# Altium schematic symbol library Transistor.SchLib: 3457 symbols (part 10 of 27) (continued)
## D45H8G
designator Q?
Complementary Silicon Power Transistor, 3-Pin TO-220, Pb-Free, Tube; Manufacturer: On Semiconductor; PartNumber: D45H8G; IC Continuous (A): 10; Polarity: PNP; DatasheetVersion: Rev. 12; PackageVersion: Rev. AG, 09/2011; PackageReference: TO-220-3-221A-09; PackageDescription: 3-Pin Flange Mount, Vertical Straight Lead, Body 9.97 x 4.445 mm, Pitch 2.54 mm; Supplier 1: Digi-Key; Supplier Part Number 1: D45H8GOS-ND; Supplier 2: Farnell; Supplier Part Number 2: 9556214; Supplier 3: Newark; Supplier Part Number 3: 45J0695; Supplier 4: Mouser; Supplier Part Number 4: 863-D45H8G; Packing: Tube; RoHS: TRUE; Mounting Technology: Through Hole; ComponentLink1Description: Manufacturer URL; ComponentLink1URL: http://www.onsemi.com/; ComponentLink2Description: Datasheet; ComponentLink2URL: http://www.onsemi.com/pub_link/Collateral/D44H-D.PDF; ComponentLink3Description: Package Specification; ComponentLink3URL: http://www.onsemi.com/pub_link/Collateral/221A-09.PDF
footprint ONSC-TO-220-3-221A-09 (FM, 3-Leads, Body 10.3x4.85mm, Pitch 2.54mm)
pins: 1 B, 2 C, 3 E

## D45VH10
designator Q?
Complementary Silicon Power Transistor, 3-Pin TO-220, Tube; Manufacturer: On Semiconductor; PartNumber: D45VH10; IC Continuous (A): 15; Polarity: PNP; DatasheetVersion: Rev. 7; PackageVersion: Rev. AG, 09/2011; PackageReference: TO-220-3-221A-09; PackageDescription: 3-Pin Flange Mount, Vertical Straight Lead, Body 9.97 x 4.445 mm, Pitch 2.54 mm; Supplier 1: Digi-Key; Supplier Part Number 1: D45VH10OS-ND; Packing: Tube; RoHS: FALSE; Mounting Technology: Through Hole; ComponentLink1Description: Manufacturer URL; ComponentLink1URL: http://www.onsemi.com/; ComponentLink2Description: Datasheet; ComponentLink2URL: http://www.onsemi.com/pub_link/Collateral/D44VH-D.PDF; ComponentLink3Description: Package Specification; ComponentLink3URL: http://www.onsemi.com/pub_link/Collateral/221A-09.PDF
footprint ONSC-TO-220-3-221A-09 (FM, 3-Leads, Body 10.3x4.85mm, Pitch 2.54mm)
pins: 1 B, 2 C, 3 E

## D45VH10G
designator Q?
Complementary Silicon Power Transistor, 3-Pin TO-220, Pb-Free, Tube; Manufacturer: On Semiconductor; PartNumber: D45VH10G; IC Continuous (A): 15; Polarity: PNP; DatasheetVersion: Rev. 7; PackageVersion: Rev. AG, 09/2011; PackageReference: TO-220-3-221A-09; PackageDescription: 3-Pin Flange Mount, Vertical Straight Lead, Body 9.97 x 4.445 mm, Pitch 2.54 mm; Supplier 1: Digi-Key; Supplier Part Number 1: D45VH10GOS-ND; Supplier 2: Farnell; Supplier Part Number 2: 1459055; Supplier 3: Newark; Supplier Part Number 3: 26K3588; Supplier 4: Mouser; Supplier Part Number 4: 863-D45VH10G; Packing: Tube; RoHS: TRUE; Mounting Technology: Through Hole; ComponentLink1Description: Manufacturer URL; ComponentLink1URL: http://www.onsemi.com/; ComponentLink2Description: Datasheet; ComponentLink2URL: http://www.onsemi.com/pub_link/Collateral/D44VH-D.PDF; ComponentLink3Description: Package Specification; ComponentLink3URL: http://www.onsemi.com/pub_link/Collateral/221A-09.PDF
footprint ONSC-TO-220-3-221A-09 (FM, 3-Leads, Body 10.3x4.85mm, Pitch 2.54mm)
pins: 1 B, 2 C, 3 E

## ECH8308-TL-H
designator Q?
P-Channel Power MOSFET, -12 V, -10 A, 12.5 mOhm, Single, 8-Pin ECH, Pb-Free, Tape and Reel; Manufacturer: On Semiconductor; PartNumber: ECH8308-TL-H; Channel Polarity: P Channel; Ciss Typ (pF): 2300; Coss Typ (pF): 720; Crss Typ (pF): 550; ID Max (A): 10; PD Max (W): 1.6; V(BR)DSS Min (V): 12; VGS(th) Max (V): 1.3; PackageReference: ECH-8; PackageDescription: 8-Pin SOT23, Body 2.9 x 2.3 mm, Pitch 0.65 mm; Supplier 1: Digi-Key; Supplier Part Number 1: ECH8308-TL-H-ND; Supplier 2: Newark; Supplier Part Number 2: 52T7754; Supplier 3: Mouser; Supplier Part Number 3: 863-ECH8308-TL-H; Configuration: Single; Package Type: SOT-28 FL / ECH-8; Packing: Tape and Reel; RoHS: Pb-Free; VGS Max (V): 10; Mounting Technology: Surface Mount; ComponentLink1Description: Manufacturer URL; ComponentLink1URL: http://www.onsemi.com/; ComponentLink2Description: Datasheet; ComponentLink2URL: http://www.onsemi.com/pub_link/Collateral/ECH8308-D.PDF; ComponentLink3Description: Package Specification; ComponentLink3URL: http://www.onsemi.com/pub_link/Collateral/ECH8308-D.PDF
footprint ONSC-ECH-8_V (SOT23, 8-Leads, Body 2.9x2.3mm, Pitch 0.65mm)
pins: 1 S, 2 S, 3 S, 4 G, 5 D, 6 D, 7 D, 8 D
text: 5, 6, 7, 8; 1, 2, 3

## ECH8309-TL-H
designator Q?
P-Channel Power MOSFET, -12 V, -9.5 A, 16 mOhm, Single, 8-Pin ECH, Pb-Free, Tape and Reel; Manufacturer: On Semiconductor; PartNumber: ECH8309-TL-H; Channel Polarity: P Channel; Ciss Typ (pF): 1780; Coss Typ (pF): 540; Crss Typ (pF): 390; ID Max (A): 9.5; PD Max (W): 1.5; V(BR)DSS Min (V): 12; VGS Max (V): 10; VGS(th) Max (V): 1.3; PackageReference: ECH-8; PackageDescription: 8-Pin SOT23, Body 2.9 x 2.3 mm, Pitch 0.65 mm; Supplier 1: Digi-Key; Supplier Part Number 1: ECH8309-TL-H-ND; Supplier 2: Mouser; Supplier Part Number 2: 863-ECH8309-TL-H; Configuration: Single; Package Type: SOT-28 FL / ECH-8; Packing: Tape and Reel; RoHS: Pb-Free; Mounting Technology: Surface Mount; ComponentLink1Description: Manufacturer URL; ComponentLink1URL: http://www.onsemi.com/; ComponentLink2Description: Datasheet; ComponentLink2URL: http://www.onsemi.com/pub_link/Collateral/ECH8309-D.PDF; ComponentLink3Description: Package Specification; ComponentLink3URL: http://www.onsemi.com/pub_link/Collateral/ECH8308-D.PDF
footprint ONSC-ECH-8_V (SOT23, 8-Leads, Body 2.9x2.3mm, Pitch 0.65mm)
pins: 1 S, 2 S, 3 S, 4 G, 5 D, 6 D, 7 D, 8 D
text: 5, 6, 7, 8; 1, 2, 3

## ECH8310-TL-H
designator Q?
P-Channel Power MOSFET, -30 V, -9 A, 17 mOhm, Single, 8-Pin ECH, Pb-Free, Tape and Reel; Manufacturer: On Semiconductor; PartNumber: ECH8310-TL-H; Channel Polarity: P Channel; Ciss Typ (pF): 1400; Coss Typ (pF): 350; Crss Typ (pF): 250; ID Max (A): 9; PD Max (W): 1.5; V(BR)DSS Min (V): 30; VGS Max (V): 20; VGS(th) Max (V): 2.6; PackageReference: ECH-8; PackageDescription: 8-Pin SOT23, Body 2.9 x 2.3 mm, Pitch 0.65 mm; Supplier 1: Digi-Key; Supplier Part Number 1: ECH8310-TL-H-ND; Supplier 2: Mouser; Supplier Part Number 2: 863-ECH8310-TL-H; Configuration: Single; Package Type: SOT-28 FL / ECH-8; Packing: Tape and Reel; RoHS: Pb-Free; Mounting Technology: Surface Mount; ComponentLink1Description: Manufacturer URL; ComponentLink1URL: http://www.onsemi.com/; ComponentLink2Description: Datasheet; ComponentLink2URL: http://www.onsemi.com/pub_link/Collateral/ECH8310-D.PDF; ComponentLink3Description: Package Specification; ComponentLink3URL: http://www.onsemi.com/pub_link/Collateral/ECH8308-D.PDF
footprint ONSC-ECH-8_V (SOT23, 8-Leads, Body 2.9x2.3mm, Pitch 0.65mm)
pins: 1 S, 2 S, 3 S, 4 G, 5 D, 6 D, 7 D, 8 D
text: 5, 6, 7, 8; 1, 2, 3

## ECH8315-TL-H
designator Q?
P-Channel Power MOSFET, -30 V, -7.5 A, 25 mOhm, Single, 8-Pin ECH, Pb-Free, Tape and Reel; Manufacturer: On Semiconductor; PartNumber: ECH8315-TL-H; Channel Polarity: P Channel; Ciss Typ (pF): 875; Coss Typ (pF): 200; Crss Typ (pF): 150; ID Max (A): 7.5; PD Max (W): 1.5; V(BR)DSS Min (V): 30; VGS Max (V): 20; VGS(th) Max (V): 2.6; PackageReference: ECH-8; PackageDescription: 8-Pin SOT23, Body 2.9 x 2.3 mm, Pitch 0.65 mm; Supplier 1: Digi-Key; Supplier Part Number 1: ECH8315-TL-H-ND; Supplier 2: Mouser; Supplier Part Number 2: 863-ECH8315-TL-H; Configuration: Single; Package Type: SOT-28 FL / ECH-8; Packing: Tape and Reel; RoHS: Pb-Free; Mounting Technology: Surface Mount; ComponentLink1Description: Manufacturer URL; ComponentLink1URL: http://www.onsemi.com/; ComponentLink2Description: Datasheet; ComponentLink2URL: http://www.onsemi.com/pub_link/Collateral/ENA1387-D.PDF; ComponentLink3Description: Package Specification; ComponentLink3URL: http://www.onsemi.com/pub_link/Collateral/ECH8308-D.PDF
footprint ONSC-ECH-8_V (SOT23, 8-Leads, Body 2.9x2.3mm, Pitch 0.65mm)
pins: 1 S, 2 S, 3 S, 4 G, 5 D, 6 D, 7 D, 8 D
text: 5, 6, 7, 8; 1, 2, 3

## ECH8320-TL-H
designator Q?
P-Channel Power MOSFET, -20 V, -9.5 A, 14.5 mOhm, Single, 8-Pin ECH, Pb-Free, Tape and Reel; Manufacturer: On Semiconductor; PartNumber: ECH8320-TL-H; Channel Polarity: P Channel; Ciss Typ (pF): 2300; Coss Typ (pF): 440; Crss Typ (pF): 340; ID Max (A): 9.5; PD Max (W): 1.6; V(BR)DSS Min (V): 20; VGS Max (V): 10; VGS(th) Max (V): 1.3; PackageReference: ECH-8; PackageDescription: 8-Pin SOT23, Body 2.9 x 2.3 mm, Pitch 0.65 mm; Supplier 1: Digi-Key; Supplier Part Number 1: ECH8320-TL-H-ND; Supplier 2: Mouser; Supplier Part Number 2: 863-ECH8320-TL-H; Configuration: Single; Package Type: SOT-28 FL / ECH-8; Packing: Tape and Reel; RoHS: Pb-Free; Mounting Technology: Surface Mount; ComponentLink1Description: Manufacturer URL; ComponentLink1URL: http://www.onsemi.com/; ComponentLink2Description: Datasheet; ComponentLink2URL: http://www.onsemi.com/pub_link/Collateral/ECH8320-D.PDF; ComponentLink3Description: Package Specification; ComponentLink3URL: http://www.onsemi.com/pub_link/Collateral/ECH8308-D.PDF
footprint ONSC-ECH-8_V (SOT23, 8-Leads, Body 2.9x2.3mm, Pitch 0.65mm)
pins: 1 S, 2 S, 3 S, 4 G, 5 D, 6 D, 7 D, 8 D
text: 5, 6, 7, 8; 1, 2, 3

## ECH8410-TL-H
designator Q?
N-Channel Power MOSFET, 30 V, 12 A, 10 mOhm, Single, 8-Pin ECH, Pb-Free, Tape and Reel; Manufacturer: On Semiconductor; PartNumber: ECH8410-TL-H; Channel Polarity: N Channel; Ciss Typ (pF): 1700; Coss Typ (pF): 300; Crss Typ (pF): 200; ID Max (A): 12; PD Max (W): 1.6; V(BR)DSS Min (V): 30; VGS Max (V): 20; VGS(th) Max (V): 2.6; PackageReference: ECH-8; PackageDescription: 8-Pin SOT23, Body 2.9 x 2.3 mm, Pitch 0.65 mm; Supplier 1: Digi-Key; Supplier Part Number 1: ECH8410-TL-H-ND; Supplier 2: Mouser; Supplier Part Number 2: 863-ECH8410-TL-H; Configuration: Single; Package Type: SOT-28 FL / ECH-8; Packing: Tape and Reel; RoHS: Pb-Free; Mounting Technology: Surface Mount; ComponentLink1Description: Manufacturer URL; ComponentLink1URL: http://www.onsemi.com/; ComponentLink2Description: Datasheet; ComponentLink2URL: http://www.onsemi.com/pub_link/Collateral/ECH8410-D.PDF; ComponentLink3Description: Package Specification; ComponentLink3URL: http://www.onsemi.com/pub_link/Collateral/ECH8308-D.PDF
footprint ONSC-ECH-8_V (SOT23, 8-Leads, Body 2.9x2.3mm, Pitch 0.65mm)
pins: 1 S, 2 S, 3 S, 4 G, 5 D, 6 D, 7 D, 8 D
text: 5, 6, 7, 8; 1, 2, 3

## ECH8419-TL-H
designator Q?
N-Channel Power MOSFET, 35 V, 9 A, 17 mOhm, Single, 8-Pin ECH, Pb-Free, Tape and Reel; Manufacturer: On Semiconductor; PartNumber: ECH8419-TL-H; Channel Polarity: N Channel; Ciss Typ (pF): 960; Coss Typ (pF): 130; Crss Typ (pF): 80; ID Max (A): 9; PD Max (W): 1.5; V(BR)DSS Min (V): 35; VGS Max (V): 20; VGS(th) Max (V): 2.6; PackageReference: ECH-8; PackageDescription: 8-Pin SOT23, Body 2.9 x 2.3 mm, Pitch 0.65 mm; Supplier 1: Digi-Key; Supplier Part Number 1: ECH8419-TL-H-ND; Supplier 2: Newark; Supplier Part Number 2: 65T1217; Supplier 3: Mouser; Supplier Part Number 3: 863-ECH8419-TL-H; Configuration: Single; Package Type: SOT-28 FL / ECH-8; Packing: Tape and Reel; RoHS: Pb-Free; Mounting Technology: Surface Mount; ComponentLink1Description: Manufacturer URL; ComponentLink1URL: http://www.onsemi.com/; ComponentLink2Description: Datasheet; ComponentLink2URL: http://www.onsemi.com/pub_link/Collateral/ENA1886-D.PDF; ComponentLink3Description: Package Specification; ComponentLink3URL: http://www.onsemi.com/pub_link/Collateral/ECH8308-D.PDF
footprint ONSC-ECH-8_V (SOT23, 8-Leads, Body 2.9x2.3mm, Pitch 0.65mm)
pins: 1 S, 2 S, 3 S, 4 G, 5 D, 6 D, 7 D, 8 D
text: 5, 6, 7, 8; 1, 2, 3

## ECH8420-TL-H
designator Q?
N-Channel Power MOSFET, 20 V, 14 A, 6.8 mOhm, Single, 8-Pin ECH, Pb-Free, Tape and Reel; Manufacturer: On Semiconductor; PartNumber: ECH8420-TL-H; Channel Polarity: N Channel; Ciss Typ (pF): 2430; Coss Typ (pF): 410; Crss Typ (pF): 330; ID Max (A): 14; PD Max (W): 1.6; V(BR)DSS Min (V): 20; VGS Max (V): 12; VGS(th) Max (V): 1.3; PackageReference: ECH-8; PackageDescription: 8-Pin SOT23, Body 2.9 x 2.3 mm, Pitch 0.65 mm; Supplier 1: Digi-Key; Supplier Part Number 1: ECH8420-TL-H-ND; Supplier 2: Newark; Supplier Part Number 2: 07W6844; Supplier 3: Mouser; Supplier Part Number 3: 863-ECH8420-TL-H; Configuration: Single; Package Type: SOT-28 FL / ECH-8; Packing: Tape and Reel; RoHS: Pb-Free; Mounting Technology: Surface Mount; ComponentLink1Description: Manufacturer URL; ComponentLink1URL: http://www.onsemi.com/; ComponentLink2Description: Datasheet; ComponentLink2URL: http://www.onsemi.com/pub_link/Collateral/ECH8420.PDF; ComponentLink3Description: Package Specification; ComponentLink3URL: http://www.onsemi.com/pub_link/Collateral/ECH8308-D.PDF
footprint ONSC-ECH-8_V (SOT23, 8-Leads, Body 2.9x2.3mm, Pitch 0.65mm)
pins: 1 S, 2 S, 3 S, 4 G, 5 D, 6 D, 7 D, 8 D
text: 5, 6, 7, 8; 1, 2, 3

## ECH8601M-TL-H
designator Q?
N-Channel Power MOSFET, 24 V, 8 A, 23 mOhm, Dual, 8-Pin ECH, Pb-Free, Tape and Reel; Manufacturer: On Semiconductor; PartNumber: ECH8601M-TL-H; Channel Polarity: N Channel; ID Max (A): 8; PD Max (W): 1.5; V(BR)DSS Min (V): 24; VGS Max (V): 12; VGS(th) Max (V): 1.3; PackageReference: ECH-8; PackageDescription: 8-Pin SOT23, Body 2.9 x 2.3 mm, Pitch 0.65 mm; Supplier 1: Digi-Key; Supplier Part Number 1: ECH8601M-TL-H-ND; Supplier 2: Mouser; Supplier Part Number 2: 863-ECH8601M-TL-H; Configuration: Dual; Package Type: SOT-28 FL / ECH-8; Packing: Tape and Reel; RoHS: Pb-Free; Mounting Technology: Surface Mount; ComponentLink1Description: Manufacturer URL; ComponentLink1URL: http://www.onsemi.com/; ComponentLink2Description: Datasheet; ComponentLink2URL: http://www.onsemi.com/pub_link/Collateral/ECH8601M-D.PDF; ComponentLink3Description: Package Specification; ComponentLink3URL: http://www.onsemi.com/pub_link/Collateral/ECH8308-D.PDF
footprint ONSC-ECH-8_V (SOT23, 8-Leads, Body 2.9x2.3mm, Pitch 0.65mm)
pins: 1 S1, 2 G1, 3 S2, 4 G2, 5 D, 6 D, 7 D, 8 D

## ECH8602M-TL-H
designator Q?
N-Channel Power MOSFET, 30 V, 6 A, 30 mOhm, Dual, 8-Pin ECH, Pb-Free, Tape and Reel; Manufacturer: On Semiconductor; PartNumber: ECH8602M-TL-H; Channel Polarity: N Channel; ID Max (A): 6; PD Max (W): 1.4; V(BR)DSS Min (V): 30; VGS Max (V): 12; VGS(th) Max (V): 1.3; PackageReference: ECH-8; PackageDescription: 8-Pin SOT23, Body 2.9 x 2.3 mm, Pitch 0.65 mm; Supplier 1: Digi-Key; Supplier Part Number 1: ECH8602M-TL-H-ND; Supplier 2: Mouser; Supplier Part Number 2: 863-ECH8602M-TL-H; Configuration: Dual; Package Type: SOT-28 FL / ECH-8; Packing: Tape and Reel; RoHS: Pb-Free; Mounting Technology: Surface Mount; ComponentLink1Description: Manufacturer URL; ComponentLink1URL: http://www.onsemi.com/; ComponentLink2Description: Datasheet; ComponentLink2URL: http://www.onsemi.com/pub_link/Collateral/ECH8602M-D.PDF; ComponentLink3Description: Package Specification; ComponentLink3URL: http://www.onsemi.com/pub_link/Collateral/ECH8308-D.PDF
footprint ONSC-ECH-8_V (SOT23, 8-Leads, Body 2.9x2.3mm, Pitch 0.65mm)
pins: 1 S1, 2 G1, 3 S2, 4 G2, 5 D, 6 D, 7 D, 8 D

## ECH8649-TL-H
designator Q?
N-Channel Power MOSFET, 20 V, 7.5 A, 17 mOhm, Dual, 8-Pin ECH, Pb-Free, Tape and Reel; Manufacturer: On Semiconductor; PartNumber: ECH8649-TL-H; Channel Polarity: N Channel; Ciss Typ (pF): 1060; Coss Typ (pF): 180; Crss Typ (pF): 135; ID Max (A): 7.5; PD Max (W): 1.4; V(BR)DSS Min (V): 20; VGS Max (V): 10; VGS(th) Max (V): 1.3; PackageReference: ECH-8; PackageDescription: 8-Pin SOT23, Body 2.9 x 2.3 mm, Pitch 0.65 mm; Supplier 1: Digi-Key; Supplier Part Number 1: ECH8649-TL-H-ND; Supplier 2: Mouser; Supplier Part Number 2: 863-ECH8649-TL-H; Configuration: Dual; Package Type: SOT-28 FL / ECH-8; Packing: Tape and Reel; RoHS: Pb-Free; Mounting Technology: Surface Mount; ComponentLink1Description: Manufacturer URL; ComponentLink1URL: http://www.onsemi.com/; ComponentLink2Description: Datasheet; ComponentLink2URL: http://www.onsemi.com/pub_link/Collateral/ECH8649-D.PDF; ComponentLink3Description: Package Specification; ComponentLink3URL: http://www.onsemi.com/pub_link/Collateral/ECH8308-D.PDF
footprint ONSC-ECH-8_V (SOT23, 8-Leads, Body 2.9x2.3mm, Pitch 0.65mm)
pins: 1 S1, 2 G1, 3 S2, 4 G2, 5 D, 6 D, 7 D, 8 D

## ECH8651R-TL-H
designator Q?
N-Channel Power MOSFET, 24 V, 10 A, 14 mOhm, Dual, 8-Pin ECH, Pb-Free, Tape and Reel; Manufacturer: On Semiconductor; PartNumber: ECH8651R-TL-H; Channel Polarity: N Channel; ID Max (A): 10; PD Max (W): 1.4; V(BR)DSS Min (V): 24; VGS Max (V): 12; VGS(th) Max (V): 1.3; PackageReference: ECH-8; PackageDescription: 8-Pin SOT23, Body 2.9 x 2.3 mm, Pitch 0.65 mm; Supplier 1: Digi-Key; Supplier Part Number 1: 869-1158-2-ND; Supplier 2: Digi-Key; Supplier Part Number 2: 869-1158-1-ND; Supplier 3: Digi-Key; Supplier Part Number 3: 869-1158-6-ND; Supplier 4: Mouser; Supplier Part Number 4: 863-ECH8651R-TL-H; Configuration: Dual; Package Type: SOT-28 FL / ECH-8; Packing: Tape and Reel; RoHS: Pb-Free; Mounting Technology: Surface Mount; ComponentLink1Description: Manufacturer URL; ComponentLink1URL: http://www.onsemi.com/; ComponentLink2Description: Datasheet; ComponentLink2URL: http://www.onsemi.com/pub_link/Collateral/ECH8651R-D.PDF; ComponentLink3Description: Package Specification; ComponentLink3URL: http://www.onsemi.com/pub_link/Collateral/ECH8308-D.PDF
footprint ONSC-ECH-8_V (SOT23, 8-Leads, Body 2.9x2.3mm, Pitch 0.65mm)
pins: 1 S1, 2 G1, 3 S2, 4 G2, 5 D, 6 D, 7 D, 8 D

## ECH8652-TL-H
designator Q?
P-Channel Power MOSFET, -12 V, -6 A, 28 mOhm, Dual, 8-Pin ECH, Pb-Free, Tape and Reel; Manufacturer: On Semiconductor; PartNumber: ECH8652-TL-H; Channel Polarity: P Channel; Ciss Typ (pF): 1000; Coss Typ (pF): 320; Crss Typ (pF): 250; ID Max (A): 6; PD Max (W): 1.3; V(BR)DSS Min (V): 12; VGS Max (V): 10; VGS(th) Max (V): 1.4; PackageReference: ECH-8; PackageDescription: 8-Pin SOT23, Body 2.9 x 2.3 mm, Pitch 0.65 mm; Supplier 1: Digi-Key; Supplier Part Number 1: ECH8652-TL-H-ND; Supplier 2: Mouser; Supplier Part Number 2: 863-ECH8652-TL-H; Configuration: Dual; Package Type: SOT-28 FL / ECH-8; Packing: Tape and Reel; RoHS: Pb-Free; Mounting Technology: Surface Mount; ComponentLink1Description: Manufacturer URL; ComponentLink1URL: http://www.onsemi.com/; ComponentLink2Description: Datasheet; ComponentLink2URL: http://www.onsemi.com/pub_link/Collateral/ECH8652-D.PDF; ComponentLink3Description: Package Specification; ComponentLink3URL: http://www.onsemi.com/pub_link/Collateral/ECH8308-D.PDF
footprint ONSC-ECH-8_V (SOT23, 8-Leads, Body 2.9x2.3mm, Pitch 0.65mm)
part A pins: 1 S1, 2 G1, 7 D1, 8 D1
part B pins: 3 S2, 4 G2, 5 D2, 6 D2
part A text: 7, 8
part B text: 5, 6

## ECH8653-TL-H
designator Q?
N-Channel Power MOSFET, 20 V, 7.5 A, 20 mOhm, Dual, 8-Pin ECH, Pb-Free, Tape and Reel; Manufacturer: On Semiconductor; PartNumber: ECH8653-TL-H; Channel Polarity: N Channel; Ciss Typ (pF): 1280; Coss Typ (pF): 170; Crss Typ (pF): 105; ID Max (A): 7.5; PD Max (W): 1.4; V(BR)DSS Min (V): 20; VGS Max (V): 10; VGS(th) Max (V): 2.4; PackageReference: ECH-8; PackageDescription: 8-Pin SOT23, Body 2.9 x 2.3 mm, Pitch 0.65 mm; Supplier 1: Digi-Key; Supplier Part Number 1: ECH8653-TL-H-ND; Supplier 2: Mouser; Supplier Part Number 2: 863-ECH8653-TL-H; Configuration: Dual; Package Type: SOT-28 FL / ECH-8; Packing: Tape and Reel; RoHS: Pb-Free; Mounting Technology: Surface Mount; ComponentLink1Description: Manufacturer URL; ComponentLink1URL: http://www.onsemi.com/; ComponentLink2Description: Datasheet; ComponentLink2URL: http://www.onsemi.com/pub_link/Collateral/ECH8653-D.PDF; ComponentLink3Description: Package Specification; ComponentLink3URL: http://www.onsemi.com/pub_link/Collateral/ECH8308-D.PDF
footprint ONSC-ECH-8_V (SOT23, 8-Leads, Body 2.9x2.3mm, Pitch 0.65mm)
pins: 1 S1, 2 G1, 3 S2, 4 G2, 5 D, 6 D, 7 D, 8 D

## ECH8654-TL-H
designator Q?
P-Channel Power MOSFET, -20 V, -5 A, 38 mOhm, Dual, 8-Pin ECH, Pb-Free, Tape and Reel; Manufacturer: On Semiconductor; PartNumber: ECH8654-TL-H; Channel Polarity: P Channel; Ciss Typ (pF): 960; Coss Typ (pF): 180; Crss Typ (pF): 140; ID Max (A): 5; PD Max (W): 1.3; V(BR)DSS Min (V): 20; VGS Max (V): 10; PackageReference: ECH-8; PackageDescription: 8-Pin SOT23, Body 2.9 x 2.3 mm, Pitch 0.65 mm; Supplier 1: Digi-Key; Supplier Part Number 1: 869-1159-2-ND; Supplier 2: Digi-Key; Supplier Part Number 2: 869-1159-1-ND; Supplier 3: Digi-Key; Supplier Part Number 3: 869-1159-6-ND; Supplier 4: Mouser; Supplier Part Number 4: 863-ECH8654-TL-H; Configuration: Dual; Package Type: SOT-28 FL / ECH-8; Packing: Tape and Reel; RoHS: Pb-Free; VGS(th) Max (V): 1.3; Mounting Technology: Surface Mount; ComponentLink1Description: Manufacturer URL; ComponentLink1URL: http://www.onsemi.com/; ComponentLink2Description: Datasheet; ComponentLink2URL: http://www.onsemi.com/pub_link/Collateral/ENA0981-D.PDF; ComponentLink3Description: Package Specification; ComponentLink3URL: http://www.onsemi.com/pub_link/Collateral/ECH8308-D.PDF
footprint ONSC-ECH-8_V (SOT23, 8-Leads, Body 2.9x2.3mm, Pitch 0.65mm)
part A pins: 1 S1, 2 G1, 7 D1, 8 D1
part B pins: 3 S2, 4 G2, 5 D2, 6 D2
part A text: 7, 8
part B text: 5, 6

## ECH8655R-TL-H
designator Q?
N-Channel Power MOSFET, 24 V, 9 A, 17 mOhm, Dual, 8-Pin ECH, Pb-Free, Tape and Reel; Manufacturer: On Semiconductor; PartNumber: ECH8655R-TL-H; Channel Polarity: N Channel; ID Max (A): 9; PD Max (W): 1.4; V(BR)DSS Min (V): 24; VGS Max (V): 12; VGS(th) Max (V): 1.3; PackageReference: ECH-8; PackageDescription: 8-Pin SOT23, Body 2.9 x 2.3 mm, Pitch 0.65 mm; Supplier 1: Digi-Key; Supplier Part Number 1: 869-1160-2-ND; Supplier 2: Digi-Key; Supplier Part Number 2: 869-1160-1-ND; Supplier 3: Digi-Key; Supplier Part Number 3: 869-1160-6-ND; Supplier 4: Mouser; Supplier Part Number 4: 863-ECH8655R-TL-H; Configuration: Dual; Package Type: SOT-28 FL / ECH-8; Packing: Tape and Reel; RoHS: Pb-Free; Mounting Technology: Surface Mount; ComponentLink1Description: Manufacturer URL; ComponentLink1URL: http://www.onsemi.com/; ComponentLink2Description: Datasheet; ComponentLink2URL: http://www.onsemi.com/pub_link/Collateral/ECH8655R-D.PDF; ComponentLink3Description: Package Specification; ComponentLink3URL: http://www.onsemi.com/pub_link/Collateral/ECH8308-D.PDF
footprint ONSC-ECH-8_V (SOT23, 8-Leads, Body 2.9x2.3mm, Pitch 0.65mm)
pins: 1 S1, 2 G1, 3 S2, 4 G2, 5 D, 6 D, 7 D, 8 D

## ECH8656-TL-H
designator Q?
N-Channel Power MOSFET, 20 V, 7.5 A, 17 mOhm, Dual, 8-Pin ECH, Pb-Free, Tape and Reel; Manufacturer: On Semiconductor; PartNumber: ECH8656-TL-H; Channel Polarity: N Channel; Ciss Typ (pF): 1060; Coss Typ (pF): 180; Crss Typ (pF): 135; ID Max (A): 7.5; PD Max (W): 1.3; V(BR)DSS Min (V): 20; VGS Max (V): 10; PackageReference: ECH-8; PackageDescription: 8-Pin SOT23, Body 2.9 x 2.3 mm, Pitch 0.65 mm; Supplier 1: Digi-Key; Supplier Part Number 1: ECH8656-TL-H-ND; Supplier 2: Mouser; Supplier Part Number 2: 863-ECH8656-TL-H; Configuration: Dual; Package Type: SOT-28 FL / ECH-8; Packing: Tape and Reel; RoHS: Pb-Free; VGS(th) Max (V): 1.3; Mounting Technology: Surface Mount; ComponentLink1Description: Manufacturer URL; ComponentLink1URL: http://www.onsemi.com/; ComponentLink2Description: Datasheet; ComponentLink2URL: http://www.onsemi.com/pub_link/Collateral/EN9010.PDF; ComponentLink3Description: Package Specification; ComponentLink3URL: http://www.onsemi.com/pub_link/Collateral/ECH8308-D.PDF
footprint ONSC-ECH-8_V (SOT23, 8-Leads, Body 2.9x2.3mm, Pitch 0.65mm)
part A pins: 1 S1, 2 G1, 7 D1, 8 D1
part B pins: 3 S2, 4 G2, 5 D2, 6 D2
part A text: 7, 8
part B text: 5, 6

## ECH8657-TL-H
designator Q?
N-Channel Power MOSFET, 35 V, 4.5 A, 59 mOhm, Dual, 8-Pin ECH, Pb-Free, Tape and Reel; Manufacturer: On Semiconductor; PartNumber: ECH8657-TL-H; Channel Polarity: N Channel; Ciss Typ (pF): 230; Coss Typ (pF): 37; Crss Typ (pF): 25; ID Max (A): 4.5; PD Max (W): 1.3; V(BR)DSS Min (V): 35; VGS Max (V): 20; VGS(th) Max (V): 2.6; PackageReference: ECH-8; PackageDescription: 8-Pin SOT23, Body 2.9 x 2.3 mm, Pitch 0.65 mm; Supplier 1: Digi-Key; Supplier Part Number 1: ECH8657-TL-H-ND; Supplier 2: Mouser; Supplier Part Number 2: 863-ECH8657-TL-H; Configuration: Dual; Package Type: SOT-28 FL / ECH-8; Packing: Tape and Reel; RoHS: Pb-Free; Mounting Technology: Surface Mount; ComponentLink1Description: Manufacturer URL; ComponentLink1URL: http://www.onsemi.com/; ComponentLink2Description: Datasheet; ComponentLink2URL: http://www.onsemi.com/pub_link/Collateral/ECH8657-D.PDF; ComponentLink3Description: Package Specification; ComponentLink3URL: http://www.onsemi.com/pub_link/Collateral/ECH8308-D.PDF
footprint ONSC-ECH-8_V (SOT23, 8-Leads, Body 2.9x2.3mm, Pitch 0.65mm)
part A pins: 1 S1, 2 G1, 7 D1, 8 D1
part B pins: 3 S2, 4 G2, 5 D2, 6 D2
part A text: 7, 8
part B text: 5, 6

## ECH8659-TL-H
designator Q?
N-Channel Power MOSFET, 30 V, 7 A, 24 mOhm, Dual, 8-Pin ECH, Pb-Free, Tape and Reel; Manufacturer: On Semiconductor; PartNumber: ECH8659-TL-H; Channel Polarity: N Channel; Ciss Typ (pF): 710; Coss Typ (pF): 120; Crss Typ (pF): 72; ID Max (A): 7; PD Max (W): 1.3; V(BR)DSS Min (V): 30; VGS Max (V): 20; VGS(th) Max (V): 2.6; PackageReference: ECH-8; PackageDescription: 8-Pin SOT23, Body 2.9 x 2.3 mm, Pitch 0.65 mm; Supplier 1: Digi-Key; Supplier Part Number 1: ECH8659-TL-H-ND; Supplier 2: Mouser; Supplier Part Number 2: 863-ECH8659-TL-H; Configuration: Dual; Package Type: SOT-28 FL / ECH-8; Packing: Tape and Reel; RoHS: Pb-Free; Mounting Technology: Surface Mount; ComponentLink1Description: Manufacturer URL; ComponentLink1URL: http://www.onsemi.com/; ComponentLink2Description: Datasheet; ComponentLink2URL: http://www.onsemi.com/pub_link/Collateral/ECH8659-D.PDF; ComponentLink3Description: Package Specification; ComponentLink3URL: http://www.onsemi.com/pub_link/Collateral/ECH8308-D.PDF
footprint ONSC-ECH-8_V (SOT23, 8-Leads, Body 2.9x2.3mm, Pitch 0.65mm)
part A pins: 1 S1, 2 G1, 7 D1, 8 D1
part B pins: 3 S2, 4 G2, 5 D2, 6 D2
part A text: 7, 8
part B text: 5, 6

## ECH8660-TL-H
designator Q?
Power MOSFET, 30 V, 4.5 A, 59 mOhm, -30 V, -4.5 A, 59 mOhm, Complementary Dual, 8-Pin ECH, Pb-Free, Tape and Reel; Manufacturer: On Semiconductor; PartNumber: ECH8660-TL-H; ID Max (A): 4.5; PD Max (W): 1.3; V(BR)DSS Min (V): 30; VGS Max (V): 20; PackageReference: ECH-8; PackageDescription: 8-Pin SOT23, Body 2.9 x 2.3 mm, Pitch 0.65 mm; Supplier 1: Digi-Key; Supplier Part Number 1: ECH8660-TL-H-ND; Supplier 2: Newark; Supplier Part Number 2: 52T7770; Supplier 3: Mouser; Supplier Part Number 3: 863-ECH8660-TL-H; Channel Polarity: Complementary; Configuration: Dual; Package Type: SOT-28 FL / ECH-8; Packing: Tape and Reel; RoHS: Pb-Free; Mounting Technology: Surface Mount; ComponentLink1Description: Manufacturer URL; ComponentLink1URL: http://www.onsemi.com/; ComponentLink2Description: Datasheet; ComponentLink2URL: http://www.onsemi.com/pub_link/Collateral/ECH8660-D.PDF; ComponentLink3Description: Package Specification; ComponentLink3URL: http://www.onsemi.com/pub_link/Collateral/ECH8308-D.PDF
footprint ONSC-ECH-8_V (SOT23, 8-Leads, Body 2.9x2.3mm, Pitch 0.65mm)
part A pins: 1 S1, 2 G1, 7 D1, 8 D1
part B pins: 3 S2, 4 G2, 5 D2, 6 D2
part A text: 7, 8
part B text: 5, 6

## ECH8661-TL-H
designator Q?
Power MOSFET, 30 V, 7 A, 24 mOhm, -30 V, -5.5 A, 39 mOhm, Complementary Dual, 8-Pin ECH, Pb-Free, Tape and Reel; Manufacturer: On Semiconductor; PartNumber: ECH8661-TL-H; PD Max (W): 1.3; V(BR)DSS Min (V): 30; VGS Max (V): 20; VGS(th) Max (V): 2.6; PackageReference: ECH-8; PackageDescription: 8-Pin SOT23, Body 2.9 x 2.3 mm, Pitch 0.65 mm; Supplier 1: Digi-Key; Supplier Part Number 1: ECH8661-TL-H-ND; Supplier 2: Mouser; Supplier Part Number 2: 863-ECH8661-TL-H; Channel Polarity: Complementary; Configuration: Dual; Package Type: SOT-28 FL / ECH-8; Packing: Tape and Reel; RoHS: Pb-Free; Mounting Technology: Surface Mount; ComponentLink1Description: Manufacturer URL; ComponentLink1URL: http://www.onsemi.com/; ComponentLink2Description: Datasheet; ComponentLink2URL: http://www.onsemi.com/pub_link/Collateral/ECH8661-D.PDF; ComponentLink3Description: Package Specification; ComponentLink3URL: http://www.onsemi.com/pub_link/Collateral/ECH8308-D.PDF
footprint ONSC-ECH-8_V (SOT23, 8-Leads, Body 2.9x2.3mm, Pitch 0.65mm)
part A pins: 1 S1, 2 G1, 7 D1, 8 D1
part B pins: 3 S2, 4 G2, 5 D2, 6 D2
part A text: 7, 8
part B text: 5, 6

## ECH8662-TL-H
designator Q?
N-Channel Power MOSFET, 40 V, 6.5 A, 30 mOhm, Dual, 8-Pin ECH, Pb-Free, Tape and Reel; Manufacturer: On Semiconductor; PartNumber: ECH8662-TL-H; Channel Polarity: N Channel; Ciss Typ (pF): 1130; Coss Typ (pF): 77; Crss Typ (pF): 60; ID Max (A): 6.5; PD Max (W): 1.3; V(BR)DSS Min (V): 40; VGS Max (V): 10; PackageReference: ECH-8; PackageDescription: 8-Pin SOT23, Body 2.9 x 2.3 mm, Pitch 0.65 mm; Supplier 1: Digi-Key; Supplier Part Number 1: ECH8662-TL-H-ND; Supplier 2: Mouser; Supplier Part Number 2: 863-ECH8662-TL-H; Configuration: Dual; Package Type: SOT-28 FL / ECH-8; Packing: Tape and Reel; RoHS: Pb-Free; VGS(th) Max (V): 1.3; Mounting Technology: Surface Mount; ComponentLink1Description: Manufacturer URL; ComponentLink1URL: http://www.onsemi.com/; ComponentLink2Description: Datasheet; ComponentLink2URL: http://www.onsemi.com/pub_link/Collateral/ECH8662-D.PDF; ComponentLink3Description: Package Specification; ComponentLink3URL: http://www.onsemi.com/pub_link/Collateral/ECH8308-D.PDF
footprint ONSC-ECH-8_V (SOT23, 8-Leads, Body 2.9x2.3mm, Pitch 0.65mm)
part A pins: 1 S1, 2 G1, 7 D1, 8 D1
part B pins: 3 S2, 4 G2, 5 D2, 6 D2
part A text: 7, 8
part B text: 5, 6

## ECH8663R-TL-H
designator Q?
N-Channel Power MOSFET, 30 V, 8 A, 20.5 mOhm, Dual, 8-Pin ECH, Pb-Free, Tape and Reel; Manufacturer: On Semiconductor; PartNumber: ECH8663R-TL-H; Channel Polarity: N Channel; ID Max (A): 8; PD Max (W): 1.4; V(BR)DSS Min (V): 30; VGS Max (V): 12; VGS(th) Max (V): 1.3; PackageReference: ECH-8; PackageDescription: 8-Pin SOT23, Body 2.9 x 2.3 mm, Pitch 0.65 mm; Supplier 1: Digi-Key; Supplier Part Number 1: ECH8663R-TL-H-ND; Supplier 2: Mouser; Supplier Part Number 2: 863-ECH8663R-TL-H; Configuration: Dual; Package Type: SOT-28 FL / ECH-8; Packing: Tape and Reel; RoHS: Pb-Free; Mounting Technology: Surface Mount; ComponentLink1Description: Manufacturer URL; ComponentLink1URL: http://www.onsemi.com/; ComponentLink2Description: Datasheet; ComponentLink2URL: http://www.onsemi.com/pub_link/Collateral/ENA1184-D.PDF; ComponentLink3Description: Package Specification; ComponentLink3URL: http://www.onsemi.com/pub_link/Collateral/ECH8308-D.PDF
footprint ONSC-ECH-8_V (SOT23, 8-Leads, Body 2.9x2.3mm, Pitch 0.65mm)
pins: 1 S1, 2 G1, 3 S2, 4 G2, 5 D, 6 D, 7 D, 8 D

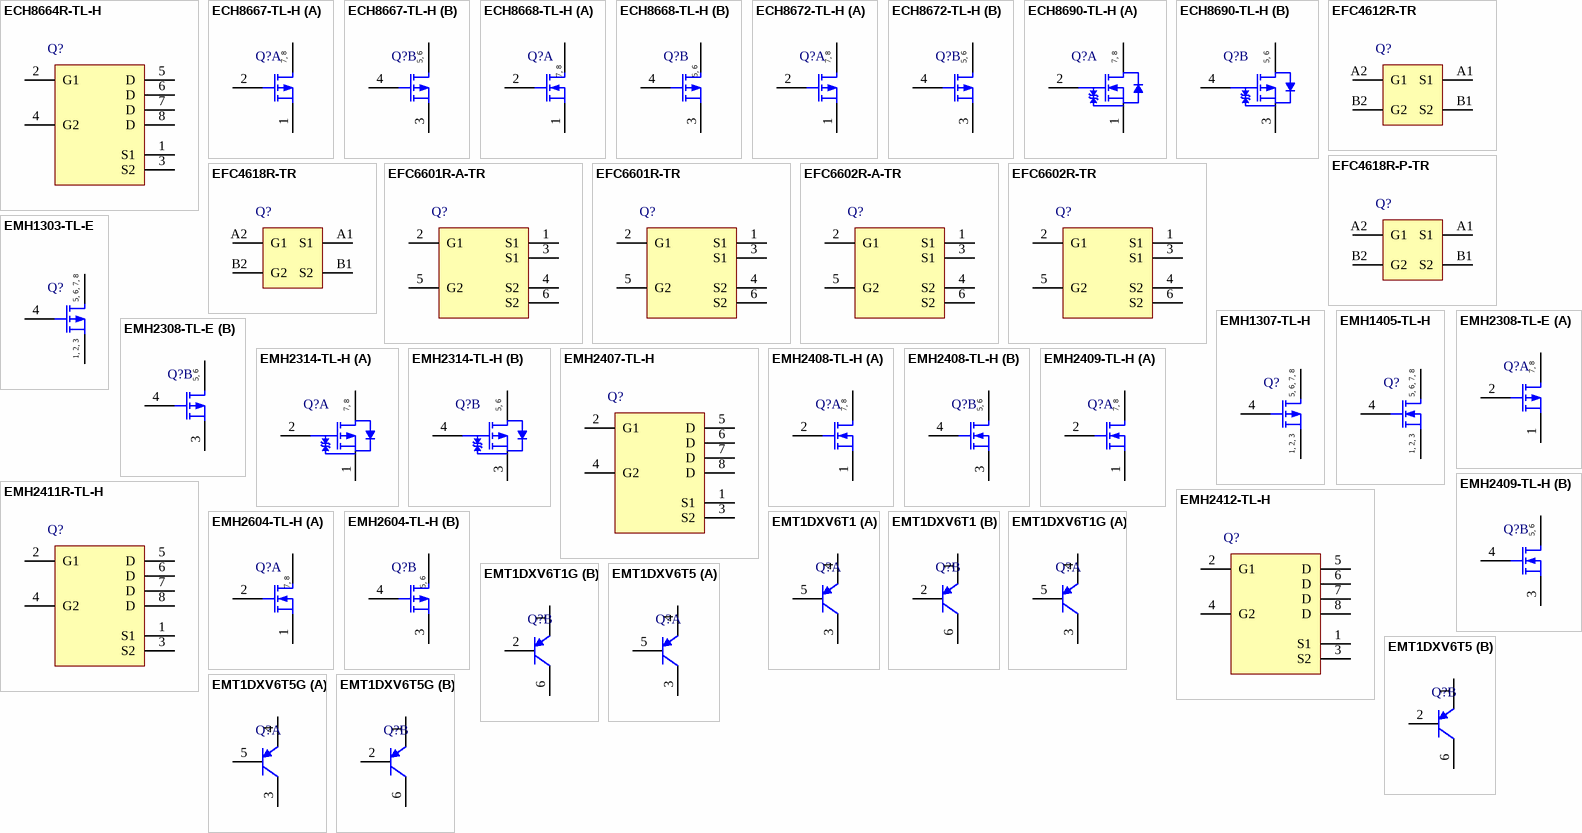
[diagram p35: symbols ECH8664R-TL-H to EMT1DXV6T5G]

## ECH8664R-TL-H
designator Q?
N-Channel Power MOSFET, 30 V, 7 A, 23.5 mOhm, Dual, 8-Pin ECH, Pb-Free, Tape and Reel; Manufacturer: On Semiconductor; PartNumber: ECH8664R-TL-H; Channel Polarity: N Channel; ID Max (A): 7; PD Max (W): 1.3; V(BR)DSS Min (V): 30; VGS Max (V): 12; PackageReference: ECH-8; PackageDescription: 8-Pin SOT23, Body 2.9 x 2.3 mm, Pitch 0.65 mm; Supplier 1: Digi-Key; Supplier Part Number 1: ECH8664R-TL-H-ND; Supplier 2: Mouser; Supplier Part Number 2: 863-ECH8664R-TL-H; Configuration: Dual; Package Type: SOT-28 FL / ECH-8; Packing: Tape and Reel; RoHS: Pb-Free; VGS(th) Max (V): 1.3; Mounting Technology: Surface Mount; ComponentLink1Description: Manufacturer URL; ComponentLink1URL: http://www.onsemi.com/; ComponentLink2Description: Datasheet; ComponentLink2URL: http://www.onsemi.com/pub_link/Collateral/ENA1185-D.PDF; ComponentLink3Description: Package Specification; ComponentLink3URL: http://www.onsemi.com/pub_link/Collateral/ECH8308-D.PDF
footprint ONSC-ECH-8_V (SOT23, 8-Leads, Body 2.9x2.3mm, Pitch 0.65mm)
pins: 1 S1, 2 G1, 3 S2, 4 G2, 5 D, 6 D, 7 D, 8 D

## ECH8667-TL-H
designator Q?
P-Channel Power MOSFET, -30 V, -5.5 A, 39 mOhm, Dual, 8-Pin ECH, Pb-Free, Tape and Reel; Manufacturer: On Semiconductor; PartNumber: ECH8667-TL-H; Channel Polarity: P Channel; Ciss Typ (pF): 600; Coss Typ (pF): 145; Crss Typ (pF): 110; ID Max (A): 5.5; PD Max (W): 1.3; V(BR)DSS Min (V): 30; VGS Max (V): 20; VGS(th) Max (V): 2.6; PackageReference: ECH-8; PackageDescription: 8-Pin SOT23, Body 2.9 x 2.3 mm, Pitch 0.65 mm; Supplier 1: Digi-Key; Supplier Part Number 1: ECH8667-TL-H-ND; Supplier 2: Mouser; Supplier Part Number 2: 863-ECH8667-TL-H; Configuration: Dual; Package Type: SOT-28 FL / ECH-8; Packing: Tape and Reel; RoHS: Pb-Free; Mounting Technology: Surface Mount; ComponentLink1Description: Manufacturer URL; ComponentLink1URL: http://www.onsemi.com/; ComponentLink2Description: Datasheet; ComponentLink2URL: http://www.onsemi.com/pub_link/Collateral/ECH8667-D.PDF; ComponentLink3Description: Package Specification; ComponentLink3URL: http://www.onsemi.com/pub_link/Collateral/ECH8308-D.PDF
footprint ONSC-ECH-8_V (SOT23, 8-Leads, Body 2.9x2.3mm, Pitch 0.65mm)
part A pins: 1 S1, 2 G1, 7 D1, 8 D1
part B pins: 3 S2, 4 G2, 5 D2, 6 D2
part A text: 7, 8
part B text: 5, 6

## ECH8668-TL-H
designator Q?
Power MOSFET, 20 V, 7.5 A, 17 mOhm, -20 V, -5 A, 38 mOhm, Complementary Dual, 8-Pin ECH, Pb-Free, Tape and Reel; Manufacturer: On Semiconductor; PartNumber: ECH8668-TL-H; PD Max (W): 1.3; V(BR)DSS Min (V): 20; VGS Max (V): 10; PackageReference: ECH-8; PackageDescription: 8-Pin SOT23, Body 2.9 x 2.3 mm, Pitch 0.65 mm; Supplier 1: Digi-Key; Supplier Part Number 1: ECH8668-TL-H-ND; Supplier 2: Mouser; Supplier Part Number 2: 863-ECH8668-TL-H; Channel Polarity: Complementary; Configuration: Dual; Package Type: SOT-28 FL / ECH-8; Packing: Tape and Reel; RoHS: Pb-Free; VGS(th) Max (V): 1.3; Mounting Technology: Surface Mount; ComponentLink1Description: Manufacturer URL; ComponentLink1URL: http://www.onsemi.com/; ComponentLink2Description: Datasheet; ComponentLink2URL: http://www.onsemi.com/pub_link/Collateral/ECH8668-D.PDF; ComponentLink3Description: Package Specification; ComponentLink3URL: http://www.onsemi.com/pub_link/Collateral/ECH8308-D.PDF
footprint ONSC-ECH-8_V (SOT23, 8-Leads, Body 2.9x2.3mm, Pitch 0.65mm)
part A pins: 1 S1, 2 G1, 7 D1, 8 D1
part B pins: 3 S2, 4 G2, 5 D2, 6 D2
part A text: 7, 8
part B text: 5, 6

## ECH8672-TL-H
designator Q?
P-Channel Power MOSFET, -20 V, -3.5 A, 85 mOhm, Dual, 8-Pin ECH, Pb-Free, Tape and Reel; Manufacturer: On Semiconductor; PartNumber: ECH8672-TL-H; Channel Polarity: P Channel; Ciss Typ (pF): 320; Coss Typ (pF): 66; Crss Typ (pF): 50; ID Max (A): 3.5; PD Max (W): 1.3; V(BR)DSS Min (V): 20; VGS Max (V): 10; PackageReference: ECH-8; PackageDescription: 8-Pin SOT23, Body 2.9 x 2.3 mm, Pitch 0.65 mm; Supplier 1: Digi-Key; Supplier Part Number 1: ECH8672-TL-H-ND; Supplier 2: Mouser; Supplier Part Number 2: 863-ECH8672-TL-H; Configuration: Dual; Package Type: SOT-28 FL / ECH-8; Packing: Tape and Reel; RoHS: Pb-Free; VGS(th) Max (V): 1.3; Mounting Technology: Surface Mount; ComponentLink1Description: Manufacturer URL; ComponentLink1URL: http://www.onsemi.com/; ComponentLink2Description: Datasheet; ComponentLink2URL: http://www.onsemi.com/pub_link/Collateral/ENA1465-D.PDF; ComponentLink3Description: Package Specification; ComponentLink3URL: http://www.onsemi.com/pub_link/Collateral/ECH8308-D.PDF
footprint ONSC-ECH-8_V (SOT23, 8-Leads, Body 2.9x2.3mm, Pitch 0.65mm)
part A pins: 1 S1, 2 G1, 7 D1, 8 D1
part B pins: 3 S2, 4 G2, 5 D2, 6 D2
part A text: 7, 8
part B text: 5, 6